# Altium footprint library ICs And Semiconductors SMD.PcbLib: 943 footprints (part 36 of 60)
Each footprint in its own frame and in the unit in brackets; x right, y up, seen from the top. Pads: shape width x height; smd on the part's side, far side on the other; paste and mask are expansions set on the pad; w line width, h text height; cw(c..) or ccw(c..) is an arc to the next point about the centre after c.
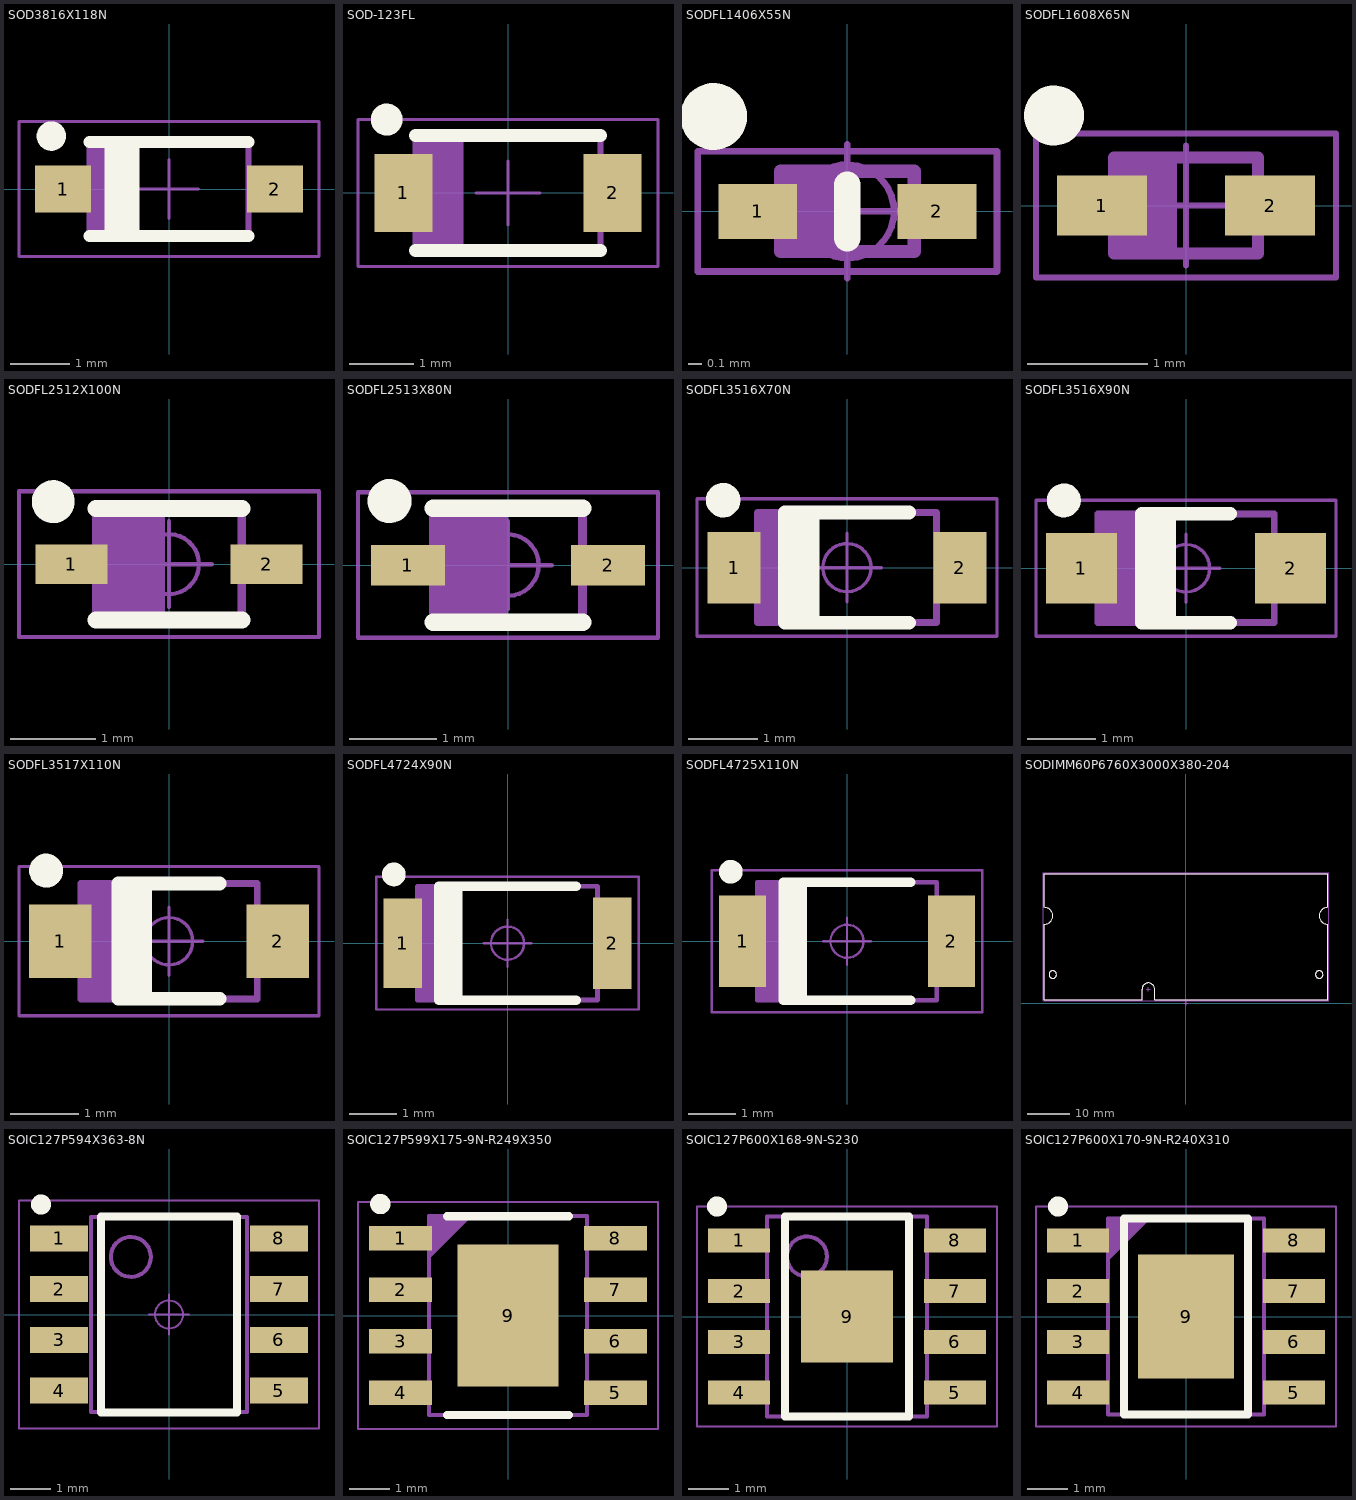
[diagram p35: the footprints below, top view; thin cyan lines are the x and y axes]

## SOD3816X118N [mm] "SOD Diode (SOD-123); 2.70mm W X 1.60mm L X 1.18mm H body, IPC Medium Density"
height 1.18
pads (2):
  rect 0.95x0.8 smd: 1(-1.8,0) 2(1.8,0)
Top Overlay:
  circle w0.25: c-2,0.9 r0.125
  lines w0.2: -1.35,-0.8 1.35,-0.8 ; -1.35,0.8 1.35,0.8 ; -1,-0.8 -1,0.8 ; -0.8,-0.8 -0.8,0.8 ; -0.6,-0.8 -0.6,0.8
Mechanical 14:
  lines w0.1: -1.25,-0.8 -1.25,0.8 ; -1.15,-0.8 -1.15,0.8 ; -1.05,-0.8 -1.05,0.8 ; -0.95,-0.8 -0.95,0.8 ; -0.85,-0.8 -0.85,0.8 ; -0.75,-0.8 -0.75,0.8 ; -0.65,-0.8 -0.65,0.8 ; -1.35,-0.8 1.35,-0.8 1.35,0.8 -1.35,0.8 -1.35,-0.8
Mechanical 15:
  lines w0.05: -0.5,0 0.5,0 ; 0,-0.5 0,0.5 ; -2.55,-1.15 2.55,-1.15 2.55,1.15 -2.55,1.15 -2.55,-1.15
3D body "SOD3816X118N.stp": height 1.18, standoff 0, extent -1.95,-0.901 1.95,0.899

## SOD-123FL [mm] "Small Outline Diode Flat Lead (SOD-123FL), Body; 2.70mm L X 1.65mm W X 1.0mm H"
height 1
pads (2):
  rect 0.91x1.22 smd: 1(-1.64,0) 2(1.64,0)
Top Overlay:
  circle w0.25: c-1.9,1.15 r0.125
  lines w0.2: -1.45,-0.9 1.45,-0.9 ; -1.45,0.9 1.45,0.9
Mechanical 14:
  lines w0.1: -1.45,-0.55 -1.75,-0.55 -1.75,0.55 -1.45,0.55 ; -1.35,-0.9 -1.35,0.9 ; -1.25,-0.9 -1.25,0.9 ; -1.15,-0.9 -1.15,0.9 ; -1.05,-0.9 -1.05,0.9 ; -0.95,-0.9 -0.95,0.9 ; -0.85,-0.9 -0.85,0.9 ; -0.75,-0.9 -0.75,0.9 ; 1.45,-0.55 1.75,-0.55 1.75,0.55 1.45,0.55 ; -1.45,-0.9 1.45,-0.9 1.45,0.9 -1.45,0.9 -1.45,-0.9
Mechanical 15:
  lines w0.05: -0.5,0 0.5,0 ; 0,-0.5 0,0.5 ; -2.35,-1.15 2.35,-1.15 2.35,1.15 -2.35,1.15 -2.35,-1.15
3D body "SOD-123LF.stp": height 1, standoff 0, extent -1.75,-0.9 1.75,0.9

## SODFL1406X55N [mm] "Small Outline Diode Flat Lead (SOD-723), 0.6mm W X 1mm L X 0.55mm H body,  IPC Medium Density"
height 0.55
pads (2):
  rect 0.59x0.41 smd: 1(-0.67,0) 2(0.67,0)
Top Overlay:
  circle w0.25: c-1,0.71 r0.125
  lines w0.2: 0,-0.2 0,0.2
Mechanical 14:
  lines w0.1: -0.4,-0.3 -0.4,0.3 ; -0.3,-0.3 -0.3,0.3 ; -0.2,-0.3 -0.2,0.3 ; -0.1,-0.3 -0.1,0.3 ; 0,-0.3 0,0.3 ; -0.5,-0.3 0.5,-0.3 0.5,0.3 -0.5,0.3 -0.5,-0.3
Mechanical 15:
  circle w0.05: c0,0 r0.35
  lines w0.05: -0.5,0 0.5,0 ; 0,-0.5 0,0.5 ; -1.12,-0.45 1.12,-0.45 1.12,0.45 -1.12,0.45 -1.12,-0.45
3D body "SODFL1406X55N.stp": height 0.55, standoff 0, extent -0.77,-0.325 0.77,0.325

## SODFL1608X65N [mm] "Ultra Small Outline Diode Flat Lead (SOD-523), Body; 1.2mm L X 0.8mm W X 0.65mm H, IPC Medium Density"
height 0.65
pads (2):
  rect 0.75x0.5 smd: 1(-0.7,0) 2(0.7,0)
Top Overlay:
  circle w0.25: c-1.1,0.75 r0.125
Mechanical 14:
  lines w0.1: -0.5,-0.4 -0.5,0.4 ; -0.425,-0.4 -0.425,0.4 ; -0.35,-0.4 -0.35,0.4 ; -0.275,-0.4 -0.275,0.4 ; -0.2,0.4 -0.2,-0.4 -0.175,-0.4 ; -0.125,-0.4 -0.125,0.4 ; -0.6,-0.4 0.6,-0.4 0.6,0.4 -0.6,0.4 -0.6,-0.4
Mechanical 15:
  lines w0.05: -0.5,0 0.5,0 ; 0,-0.5 0,0.5 ; -1.25,-0.6 1.25,-0.6 1.25,0.6 -1.25,0.6 -1.25,-0.6
3D body "SODFL1608X65N.stp": height 0.65, standoff 0, extent -0.825,-0.425 0.825,0.425

## SODFL2512X100N [mm] "SODFL Diode; 1.70mm W X 1.25mm L X 1.00mm H body, IPC Medium Density"
height 1
pads (2):
  rect 0.84x0.46 smd: 1(-1.14,0) 2(1.14,0)
Top Overlay:
  circle w0.25: c-1.35,0.73 r0.125
  lines w0.2: -0.85,-0.65 0.85,-0.65 ; -0.85,0.65 0.85,0.65
Mechanical 14:
  region: -0.85,-0.625 -0.05,-0.625 -0.05,0.625 -0.85,0.625
  lines w0.1: -0.85,-0.625 -0.85,0.625 0.85,0.625 0.85,-0.625 -0.85,-0.625
Mechanical 15:
  circle w0.05: c0,0 r0.35
  lines w0.05: -0.5,0 0.5,0 ; 0,-0.5 0,0.5 ; -1.75,-0.85 -1.75,0.85 1.75,0.85 1.75,-0.85 -1.75,-0.85
3D body "SODFL2512X100N.stp": height 1, standoff 0, extent -1.35,-0.65 1.35,0.65

## SODFL2513X80N [mm] "SODFL Diode (SOD323F); 1.70mm W X 1.25mm L X 0.80mm H body, IPC Medium Density"
height 0.8
pads (2):
  rect 0.84x0.46 smd: 1(-1.14,0) 2(1.14,0)
Top Overlay:
  circle w0.25: c-1.35,0.73 r0.125
  lines w0.2: -0.85,-0.65 0.85,-0.65 ; -0.85,0.65 0.85,0.65
Mechanical 14:
  lines w0.1: -0.75,-0.625 -0.75,0.625 ; -0.65,-0.625 -0.65,0.625 ; -0.55,-0.625 -0.55,0.625 ; -0.45,-0.625 -0.45,0.625 ; -0.35,-0.625 -0.35,0.625 ; -0.25,-0.625 -0.25,0.625 ; -0.15,-0.625 -0.15,0.625 ; -0.05,-0.625 -0.05,0.625 ; -0.85,-0.625 0.85,-0.625 0.85,0.625 -0.85,0.625 -0.85,-0.625
Mechanical 15:
  circle w0.05: c0,0 r0.35
  lines w0.05: -0.5,0 0.5,0 ; 0,-0.5 0,0.5 ; -1.71,-0.83 1.71,-0.83 1.71,0.83 -1.71,0.83 -1.71,-0.83
3D body "SODFL2513X80N.stp": height 0.8, standoff 0, extent -1.35,-0.65 1.35,0.65

## SODFL3516X70N [mm] "SODFL Diode; 2.60mm W X 1.60mm L X 0.70mm H Body, IPC Medium Density"
height 0.7
pads (2):
  rect 0.77x1.04 smd: 1(-1.64,0) 2(1.64,0)
Top Overlay:
  circle w0.25: c-1.8,0.98 r0.125
  lines w0.2: -0.7,-0.8 -0.7,0.8 ; -0.5,-0.8 -0.5,0.8 ; 0.9,-0.8 -0.9,-0.8 -0.9,0.8 0.9,0.8
Mechanical 14:
  lines w0.1: -1.2,-0.8 -1.2,0.8 ; -1.1,-0.8 -1.1,0.8 ; -1,-0.8 -1,0.8 ; -0.9,-0.8 -0.9,0.8 ; -0.8,-0.8 -0.8,0.8 ; -0.7,-0.8 -0.7,0.8 ; -0.6,-0.8 -0.6,0.8 ; -0.5,-0.8 -0.5,0.8 ; -1.3,-0.8 -1.3,0.8 1.3,0.8 1.3,-0.8 -1.3,-0.8
Mechanical 15:
  circle w0.05: c0,0 r0.35
  lines w0.05: -0.5,0 0.5,0 ; 0,-0.5 0,0.5 ; -2.18,-1 -2.18,1 2.18,1 2.18,-1 -2.18,-1
3D body "SODFL3516X70N.stp": height 0.7, standoff 0, extent -1.7,-0.8 1.7,0.8

## SODFL3516X90N [mm] "Small Outline Diode Flat Lead (SOD-123), Body; 2.60mm L X 1.6mm W X 0.8mm H"
height 0.9
pads (2):
  rect 1.04x1.04 smd: 1(-1.54,0) 2(1.54,0)
Top Overlay:
  circle w0.25: c-1.8,1 r0.125
  lines w0.2: -0.45,-0.8 -0.45,0.8 ; -0.25,-0.8 -0.25,0.8 ; 0.65,-0.8 -0.65,-0.8 -0.65,0.8 0.65,0.8
Mechanical 14:
  lines w0.1: -1.2,-0.8 -1.2,0.8 ; -1.1,-0.8 -1.1,0.8 ; -1,-0.8 -1,0.8 ; -0.9,-0.8 -0.9,0.8 ; -0.8,-0.8 -0.8,0.8 ; -0.7,-0.8 -0.7,0.8 ; -0.6,-0.8 -0.6,0.8 ; -0.5,-0.8 -0.5,0.8 ; -1.3,-0.8 1.3,-0.8 1.3,0.8 -1.3,0.8 -1.3,-0.8
Mechanical 15:
  circle w0.05: c0,0 r0.35
  lines w0.05: -0.5,0 0.5,0 ; 0,-0.5 0,0.5 ; -2.21,-1 2.21,-1 2.21,1 -2.21,1 -2.21,-1
3D body "SODFL3516X90N.stp": height 1, standoff 0, extent -1.75,-0.8 1.75,0.8

## SODFL3517X110N [mm] "SODFL Diode (SOD123W); 2.60mm W X 1.70mm L X 1.10mm H body, IPC Medium Density"
height 1.1
pads (2):
  rect 0.92x1.08 smd: 1(-1.6,0) 2(1.6,0)
Top Overlay:
  circle w0.25: c-1.81,1.04 r0.125
  lines w0.2: -0.55,-0.85 -0.55,0.85 ; -0.35,-0.85 -0.35,0.85 ; 0.75,-0.85 -0.75,-0.85 -0.75,0.85 0.75,0.85
Mechanical 14:
  lines w0.1: -1.2,-0.85 -1.2,0.85 ; -1.1,-0.85 -1.1,0.85 ; -1,-0.85 -1,0.85 ; -0.9,-0.85 -0.9,0.85 ; -0.8,-0.85 -0.8,0.85 ; -0.7,-0.85 -0.7,0.85 ; -0.6,-0.85 -0.6,0.85 ; -0.5,-0.85 -0.5,0.85 ; -1.3,-0.85 1.3,-0.85 1.3,0.85 -1.3,0.85 -1.3,-0.85
Mechanical 15:
  circle w0.05: c0,0 r0.35
  lines w0.05: -0.5,0 0.5,0 ; 0,-0.5 0,0.5 ; -2.21,-1.1 2.21,-1.1 2.21,1.1 -2.21,1.1 -2.21,-1.1
3D body "SODFL3517X110N.stp": height 1.1, standoff 0, extent -1.85,-0.95 1.85,0.95

## SODFL4724X90N [mm] "SODFL Diode; 3.80mm W X 2.40mm L X 0.90mm H body, IPC Medium Density"
height 0.85
pads (2):
  rect 0.82x1.89 smd: 1(-2.21,0)
  rect 0.82x1.93 smd: 2(2.21,0)
Top Overlay:
  circle w0.25: c-2.4,1.45 r0.125
  lines w0.2: -1.25,-1.2 -1.25,1.2 ; -1.05,-1.2 -1.05,1.2 ; 1.45,-1.2 -1.45,-1.2 -1.45,1.2 1.45,1.2
Mechanical 14:
  lines w0.1: -1.8,-1.2 -1.8,1.2 ; -1.7,-1.2 -1.7,1.2 ; -1.6,-1.2 -1.6,1.2 ; -1.5,-1.2 -1.5,1.2 ; -1.4,-1.2 -1.4,1.2 ; -1.3,-1.2 -1.3,1.2 ; -1.2,-1.2 -1.2,1.2 ; -1.1,-1.2 -1.1,1.2 ; -1.9,-1.2 -1.9,1.2 1.9,1.2 1.9,-1.2 -1.9,-1.2
Mechanical 15:
  circle w0.05: c0,0 r0.35
  lines w0.05: -0.5,0 0.5,0 ; 0,-0.5 0,0.5 ; -2.77,-1.4 -2.77,1.4 2.77,1.4 2.77,-1.4 -2.77,-1.4
3D body "SODFL4724X90N.stp": height 0.85, standoff 0, extent -2.35,-1.2 2.35,1.2

## SODFL4725X110N [mm] "SOD128, SODFL Diode; 3.80mm W X 2.50mm L X 1.10mm H Body, IPC Medium Density"
height 1.1
pads (2):
  rect 1x1.93 smd: 1(-2.21,0) 2(2.21,0)
Top Overlay:
  circle w0.25: c-2.46,1.47 r0.125
  lines w0.2: -1.15,-1.25 -1.15,1.25 ; -0.95,-1.25 -0.95,1.25 ; 1.35,-1.25 -1.35,-1.25 -1.35,1.25 1.35,1.25
Mechanical 14:
  lines w0.1: -1.8,-1.25 -1.8,1.25 ; -1.7,-1.25 -1.7,1.25 ; -1.6,-1.25 -1.6,1.25 ; -1.5,-1.25 -1.5,1.25 ; -1.4,-1.25 -1.4,1.25 ; -1.3,-1.25 -1.3,1.25 ; -1.2,-1.25 -1.2,1.25 ; -1.1,-1.25 -1.1,1.25 ; -1.9,-1.25 1.9,-1.25 1.9,1.25 -1.9,1.25 -1.9,-1.25
Mechanical 15:
  circle w0.05: c0,0 r0.35
  lines w0.05: -0.5,0 0.5,0 ; 0,-0.5 0,0.5 ; -2.86,-1.5 2.86,-1.5 2.86,1.5 -2.86,1.5 -2.86,-1.5
3D body "SODFL4725X110N.stp": height 1.1, standoff 0, extent -2.5,-1.35 2.5,1.35

## SODIMM60P6760X3000X380-204 [mm] "SODIMM DDR3 204-Pin SDRAM Module, Body; 67.6mm L X 30mm W X 3.8mm H"
height 3.8
Top Overlay:
  circle w0.2: c-31.8,6.8 r0.9
  circle w0.2: c31.8,6.8 r0.9
  lines w0.2: -33.8,0.8 -10.5,0.8 -10.5,3.3 cw(c-9,3.3) -7.5,3.3 -7.5,0.8 33.8,0.8 33.8,18.8 cw(c33.8,20.8) 33.8,22.8 33.8,30.8 -33.8,30.8 -33.8,22.8 cw(c-33.8,20.8) -33.8,18.8 -33.8,0.8
Mechanical 8:
  lines w0.1: -9.5,3.3 -9,3.3 ; -9,2.8 -9,3.3 ; -9,3.8 -9,3.3 ; -8.5,3.3 -9,3.3 ; -0.5,0 0,0 ; 0,-0.5 0,0 ; 0,0.5 0,0 ; 0.5,0 0,0
Mechanical 14:
  circle w0.1: c-31.8,6.8 r0.9
  circle w0.1: c31.8,6.8 r0.9
  lines w0.1: -33.8,0.8 -33.8,18.8 ccw(c-33.8,20.8) -33.8,22.8 -33.8,30.8 33.8,30.8 33.8,22.8 ccw(c33.8,20.8) 33.8,18.8 33.8,0.8 -7.5,0.8 -7.5,3.3 ccw(c-9,3.3) -10.5,3.3 -10.5,0.8 -33.8,0.8
Mechanical 15:
  lines w0.05: -34.05,0.55 -34.05,31.05 34.05,31.05 34.05,0.55 -34.05,0.55
3D body "SODIMM60P6760X3000X380-204.stp": height 3.8, standoff 0, extent -33.8,0.8 33.8,30.8

## SOIC127P594X363-8N [mm] "SOIC, 1.27mm pitch; 8  pin, 3.91mm W X 4.88mm L, IPC Medium Density"
height 3.63
pads (8):
  rect 1.45x0.65 smd: 1(-2.75,1.905) 2(-2.75,0.635) 3(-2.75,-0.635) 4(-2.75,-1.905) 5(2.75,-1.905) 6(2.75,-0.635) 7(2.75,0.635) 8(2.75,1.905)
Top Overlay:
  circle w0.25: c-3.2,2.75 r0.125
  lines w0.2: -1.7,-2.45 1.7,-2.45 1.7,2.45 -1.7,2.45 -1.7,-2.45
Mechanical 14:
  circle w0.1: c-0.955,1.44 r0.5
  lines w0.1: -1.955,-2.44 1.955,-2.44 1.955,2.44 -1.955,2.44 -1.955,-2.44
Mechanical 15:
  circle w0.05: c0,0 r0.35
  lines w0.05: -0.5,0 0.5,0 ; 0,-0.5 0,0.5 ; -3.75,-2.85 3.75,-2.85 3.75,2.85 -3.75,2.85 -3.75,-2.85
3D body "SOIC127P594X363-8N.stp": height 3.63, standoff 0, extent -3.1,-2.5 3.1,2.5

## SOIC127P599X175-9N-R249X350 [mm] "SOIC,1.27mm pitch;8 pin,3.899mm W X 4.903mm L X 1.75mm H body ((w/thermal tab 2.489mm X 3.505mm), IPC Medium Density"
height 1.7
pads (9):
  rect 1.55x0.6 smd: 1(-2.65,1.905) 2(-2.65,0.635) 3(-2.65,-0.635) 4(-2.65,-1.905) 5(2.65,-1.905) 6(2.65,-0.635) 7(2.65,0.635) 8(2.65,1.905)
  rect 2.49x3.5 smd: 9(0,0)
Top Overlay:
  circle w0.25: c-3.15,2.75 r0.125
  lines w0.2: -1.5,-2.45 1.5,-2.45 ; -1.5,2.45 1.5,2.45
Mechanical 14:
  lines w0.1: -1.95,1.451 -0.95,2.451 ; -1.95,1.551 -1.05,2.451 ; -1.95,1.651 -1.15,2.451 ; -1.95,1.751 -1.25,2.451 ; -1.95,1.851 -1.35,2.451 ; -1.95,1.951 -1.45,2.451 ; -1.95,2.051 -1.55,2.451 ; -1.95,2.151 -1.65,2.451 ; -1.95,2.251 -1.75,2.451 ; -1.95,2.351 -1.85,2.451 ; -1.95,-2.451 -1.95,2.451 1.95,2.451 1.95,-2.451 -1.95,-2.451
Mechanical 15:
  circle w0.05: c0,0 r0.35
  lines w0.05: -0.5,0 0.5,0 ; 0,-0.5 0,0.5 ; -3.7,-2.8 -3.7,2.8 3.7,2.8 3.7,-2.8 -3.7,-2.8
3D body "SOIC127P599X175-9N-R249X350.stp": height 1.75, standoff 0, extent -3.1,-2.5 3.1,2.5

## SOIC127P600X168-9N-S230 [mm] "SOIC, 1.27mm pitch; 8 pin, 4.00mm W X 5.00mm L X 1.68mm H body (w/thermal tab), IPC Medium Density"
height 1.68
pads (9):
  rect 1.55x0.6 smd: 1(-2.7,1.905) 2(-2.7,0.635) 3(-2.7,-0.635) 4(-2.7,-1.905) 5(2.7,-1.905) 6(2.7,-0.635) 7(2.7,0.635) 8(2.7,1.905)
  rect 2.3x2.3 smd: 9(0,0)
Top Overlay:
  circle w0.25: c-3.25,2.75 r0.125
  lines w0.2: -1.55,-2.5 1.55,-2.5 1.55,2.5 -1.55,2.5 -1.55,-2.5
Top Paste:
  region: -0.69,0.69 0.69,0.69 0.69,-0.69 -0.69,-0.69
Mechanical 14:
  circle w0.1: c-1,1.5 r0.5
  lines w0.1: -2,-2.5 2,-2.5 2,2.5 -2,2.5 -2,-2.5
Mechanical 15:
  lines w0.05: -0.5,0 0.5,0 ; 0,-0.5 0,0.5 ; -3.75,-2.75 3.75,-2.75 3.75,2.75 -3.75,2.75 -3.75,-2.75
3D body "SOIC127P600X168-9N-S230.stp": height 1.68, standoff 0, extent -3.1,-2.5 3.1,2.5

## SOIC127P600X170-9N-R240X310 [mm] "SOIC 8, Pitch 1.27mm - Body 4x5mm, (w/Thermal Tab 2.4mm X 3.1mm), IPC Medium Density"
height 1.7
pads (9):
  rect 1.55x0.6 smd: 1(-2.7,1.905) 2(-2.7,0.635) 3(-2.7,-0.635) 4(-2.7,-1.905) 5(2.7,-1.905) 6(2.7,-0.635) 7(2.7,0.635) 8(2.7,1.905)
  rect 2.4x3.1 smd: 9(0,0)
Top Overlay:
  circle w0.25: c-3.2,2.75 r0.125
  lines w0.2: -1.55,-2.45 -1.55,2.45 1.55,2.45 1.55,-2.45 -1.55,-2.45
Mechanical 14:
  lines w0.1: -1.95,1.45 -0.95,2.45 ; -1.95,1.55 -1.05,2.45 ; -1.95,1.65 -1.15,2.45 ; -1.95,1.75 -1.25,2.45 ; -1.95,1.85 -1.35,2.45 ; -1.95,1.95 -1.45,2.45 ; -1.95,2.05 -1.55,2.45 ; -1.95,2.15 -1.65,2.45 ; -1.95,2.25 -1.75,2.45 ; -1.95,2.35 -1.85,2.45 ; -1.95,-2.45 -1.95,2.45 1.95,2.45 1.95,-2.45 -1.95,-2.45
Mechanical 15:
  circle w0.05: c0,0 r0.35
  lines w0.05: -0.5,0 0.5,0 ; 0,-0.5 0,0.5 ; -3.75,-2.75 -3.75,2.75 3.75,2.75 3.75,-2.75 -3.75,-2.75
3D body "SOIC127P600X170-9N-R240X310.stp": height 1.75, standoff 0, extent -3.1,-2.5 3.1,2.5